# Altium footprint library MainFPs.PcbLib: 206 footprints (part 9 of 13)
Each footprint in its own frame and in the unit in brackets; x right, y up, seen from the top. Pads: shape width x height; smd on the part's side, far side on the other; paste and mask are expansions set on the pad; w line width, h text height; cw(c..) or ccw(c..) is an arc to the next point about the centre after c.
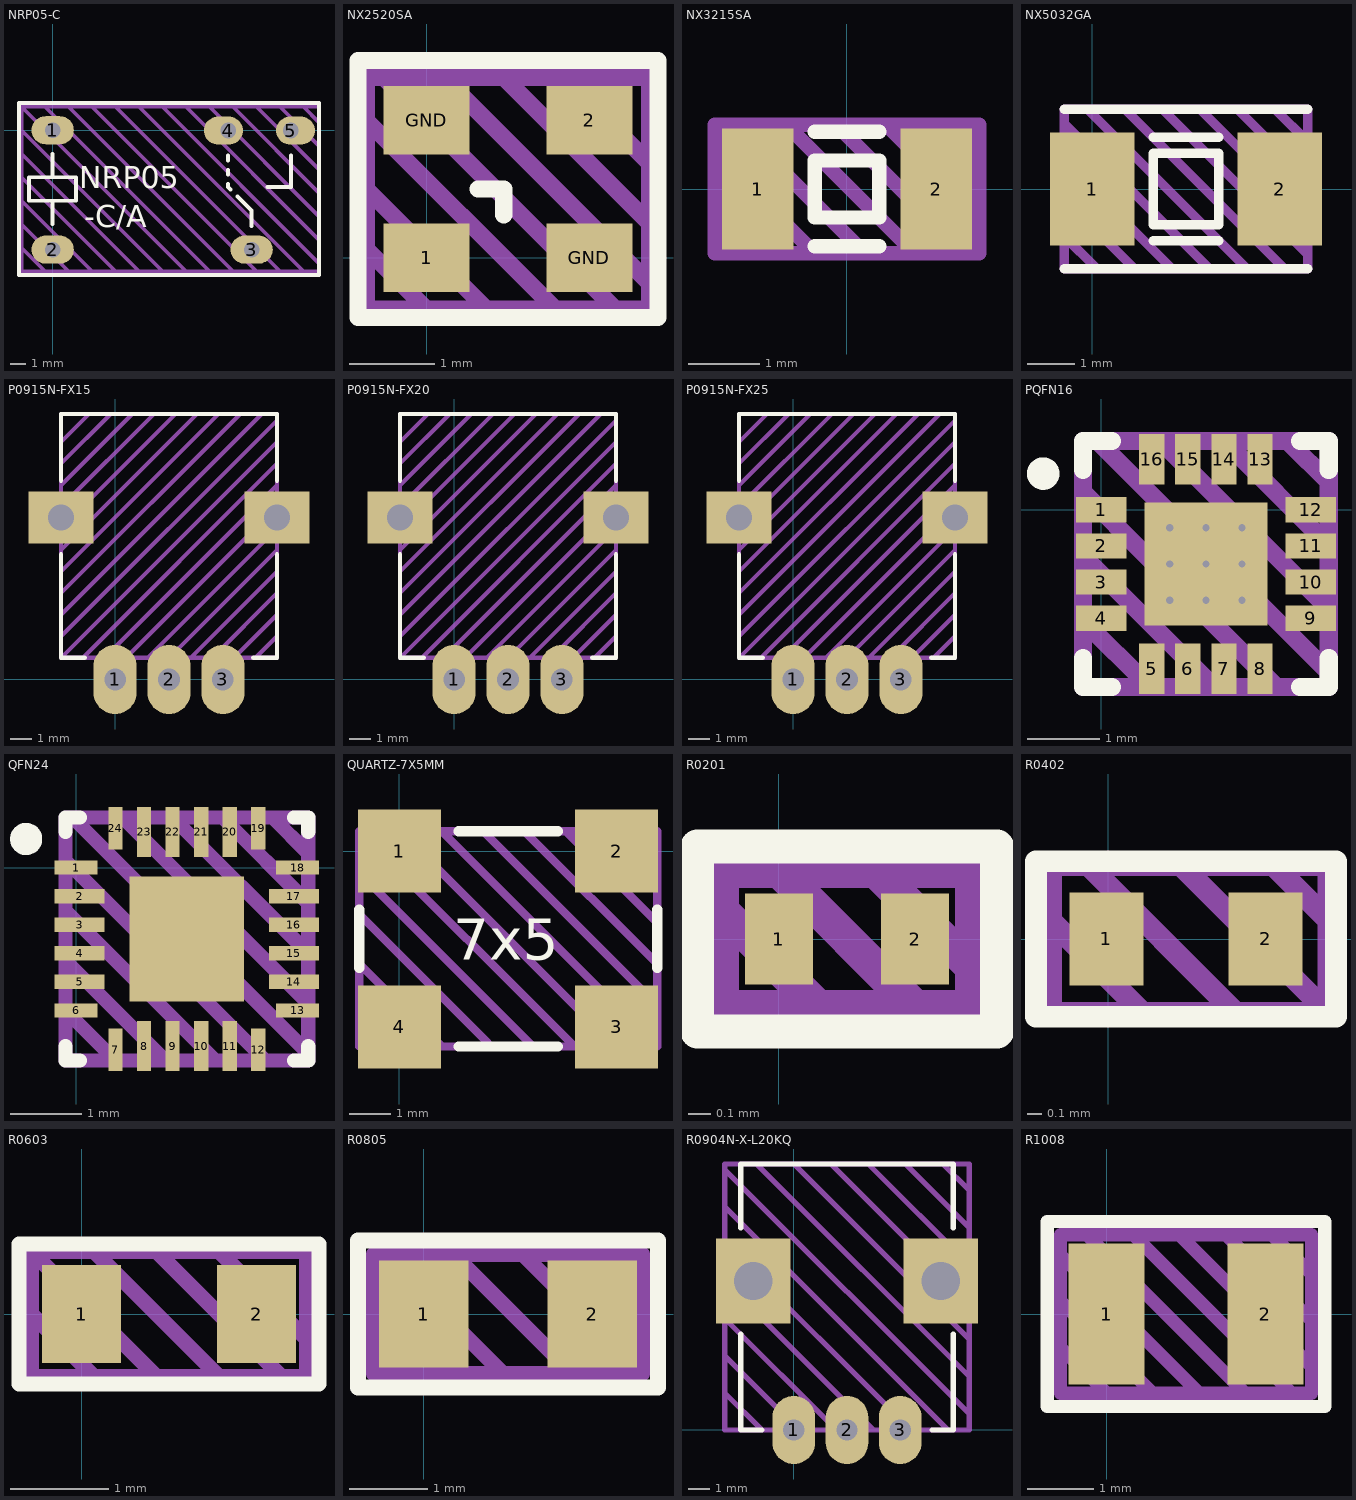
[diagram p8: the footprints below, top view; thin cyan lines are the x and y axes]

## NRP05-C [mm]
pads (5):
  oval 2.7x1.8 hole 1: 1(0,0) 2(0,-7.62) 3(12.7,-7.62)
  oval 2.5x1.8 hole 1 copper offset -0.3,0: 4(11.2,-0.02)
  oval 2.5x1.8 hole 1 copper offset 0.3,0: 5(15.2,-0.02)
Top Overlay:
  lines w0.25: 0,-6 0,-4.5 ; 0,-3 0,-1.5 ; 11.2,-3.42 11.2,-3.52 11.2,-3.62 11.35,-3.77 ; 11.2,-2.82 11.2,-2.52 ; 11.2,-1.92 11.2,-1.62 ; 12.7,-6.12 12.7,-5.12 11.8,-4.22 ; 13.7,-3.62 14.2,-3.62 15.2,-3.62 15.2,-1.62 ; 11.8,-4.22 11.8,-4.22 ; -2.15,-9.25 17,-9.25 17,1.75 -2.15,1.75 -2.15,-9.25 ; -1.5,-4.5 -1.5,-3 1.5,-3 1.5,-4.5 -1.5,-4.5
  text "-C/A" at 2,-6.2 h1.4
  text "NRP05" at 1.7,-3.7 h1.4
Draw:
  lines w0.25: -2,-6 1,-9 1.5,-9 ; -2,-4.5 2.5,-9 ; -2,-3 4,-9 ; -2,-1.5 5.5,-9 6,-9 ; -2,0 7,-9 7.5,-9 ; -0.5,-9 -2,-7.5 ; -0.5,1.5 10,-9 10.5,-9 ; 1,1.5 11.5,-9 ; 2.5,1.5 13,-9 ; 4,1.5 14.5,-9 ; 5.5,1.5 16,-9 ; 7,1.5 17,-8.5 ; 8.5,1.5 17,-7 17,-7.5 ; 9,-9 8.5,-9 -2,1.5 ; 10,1.5 17,-5.5 17,-6 ; 11.5,1.5 17,-4 ; 13,1.5 17,-2.5 17,-3 ; 14.5,1.5 17,-1 17,-1.5 ; 16,1.5 17,0.5 ; -2,-7.5 -2,-7.5 ; -2,1.5 -2,-9 17,-9 17,1.5 -2,1.5 ; 2.5,-9 2.5,-9 ; 17,0.5 17,0.5
Info:
  text "'.Comment'" at -1.905,-12.065 h2
3D body: height 1, standoff -3, extent 12.55,-8.02 12.85,-7.22
3D body: height 1, standoff -3, extent 15.039,-0.425 15.339,0.375
3D body: height 1, standoff -3, extent 11.051,-0.425 11.351,0.375
3D body: height 1, standoff -3, extent -0.15,-8 0.15,-7.2
3D body: height 1, standoff -3, extent -0.15,-0.4 0.15,0.4
3D body: height 15.6, standoff 0.4, extent -2,-9 16.9,1.5
3D body: height 0.6, standoff 0, extent 0.5,-9 1.8,-8.7
3D body: height 0.6, standoff 0, extent 12.7,-9 14,-8.7
3D body: height 0.6, standoff 0, extent 12.7,1.2 14,1.5
3D body: height 0.6, standoff 0, extent 0.5,1.2 1.8,1.5

## NX2520SA [mm]
pads (4):
  rect 1x0.8 smd: 1(0,0) 2(1.9,1.6) GND(0,1.6) GND(1.9,0)
Top Overlay:
  lines w0.2: 0.6,0.8 0.9,0.8 0.9,0.5 ; -0.8,-0.7 2.7,-0.7 2.7,2.3 -0.8,2.3 -0.8,-0.7
Draw:
  lines w0.2: -0.7,0.1 0,-0.6 0.2,-0.6 ; -0.7,0.8 0.7,-0.6 1,-0.6 ; -0.7,1.6 1.5,-0.6 1.7,-0.6 ; -0.5,2.1 2.2,-0.6 2.4,-0.6 ; 0.2,2.1 2.6,-0.3 ; 0.9,2.1 2.6,0.4 2.6,0.2 ; 1.6,2.1 2.6,1.1 2.6,0.8 ; -0.7,-0.6 2.6,-0.6 2.6,2.1 -0.7,2.1 -0.7,-0.6
Info:
  text "'.Comment'" at -2.286,-1.837 h0.75
3D body: height 0.58, standoff 0, extent -0.275,-0.175 2.175,1.778
3D body: height 0.6, standoff 0.01, extent -0.253,-0.15 2.153,1.75
3D body: height 0.5, standoff 0.02, extent -0.3,-0.2 2.2,1.803

## NX3215SA [mm]
pads (2):
  rect 1x1.7 smd: 1(-1.25,0) 2(1.25,0)
Top Overlay:
  lines w0.2: -0.45,-0.8 0.45,-0.8 ; -0.45,0.8 0.45,0.8 ; -0.45,-0.4 0.45,-0.4 0.45,0.4 -0.45,0.4 -0.45,-0.4
Draw:
  lines w0.2: -1.85,-0.2 -1.15,-0.9 -0.95,-0.9 -1.35,-0.9 ; -1.85,0.5 -0.45,-0.9 -0.15,-0.9 ; -1.55,0.9 0.25,-0.9 0.45,-0.9 ; -0.85,0.9 0.95,-0.9 ; -0.15,0.9 1.65,-0.9 ; 0.55,0.9 1.85,-0.4 1.85,-0.6 ; 1.25,0.9 1.85,0.3 1.85,0 ; -1.85,-0.9 -1.85,0.9 1.85,0.9 1.85,-0.9 -1.85,-0.9
Info:
  text "'.Comment'" at -3.186,-2.037 h0.75
3D body: height 0.58, standoff 0.01, extent -1.45,-0.8 1.45,0.8
3D body: height 0.6, standoff 0.01, extent -1.425,-0.775 1.425,0.775
3D body: height 0.5, standoff 0, extent -1.475,-0.825 1.475,0.825

## NX5032GA [mm] "SMD Glass Sealing Crystals"
pads (2):
  rect 1.8x2.4 smd: 1(0,0) 2(4,0)
Top Overlay:
  lines w0.2: -0.6,-1.7 4.6,-1.7 ; -0.6,1.7 4.6,1.7 ; 1.3,-1.1 2.7,-1.1 ; 1.3,1.1 2.7,1.1 ; 1.3,-0.762 2.7,-0.762 2.7,0.762 1.3,0.762 1.3,-0.762
Draw:
  lines w0.2: -0.6,-1 0.1,-1.7 ; -0.6,-0.2 0.9,-1.7 ; -0.6,0.6 1.7,-1.7 ; -0.6,1.4 2.5,-1.7 ; -0.1,1.7 3.3,-1.7 ; 0.7,1.7 4.1,-1.7 ; 1.5,1.7 4.6,-1.4 ; 2.3,1.7 4.6,-0.6 ; 3.1,1.7 4.6,0.2 ; 3.9,1.7 4.6,1 ; -0.6,-1.7 -0.6,1.7 4.6,1.7 4.6,-1.7 -0.6,-1.7
Info:
  text "'.Comment'" at -1.186,-2.837 h0.75
3D body: height 0.6, standoff 0, extent -0.6,-1.7 4.6,1.7
3D body: height 0.8, standoff 0.6, extent -0.4,-1.5 4.4,1.5

## P0915N-FX15 [mm] "Model P09x Series Potentiometer"
pads (5):
  oval 2x3.2 hole 1: 1(0,0) 2(2.5,0) 3(5,0)
  rect 3x2.4 hole 1.2 square: ""(-2.5,7.5) ""(7.5,7.5)
Top Overlay:
  lines w0.2: -2.5,5.8 -2.5,1 -1.4,1 ; -2.5,9.2 -2.5,12.3 7.5,12.3 7.5,9.2 ; 6.4,1 7.5,1 7.5,5.8
Draw:
  lines w0.2: -2.5,2 7.5,12 ; -2.5,3 6.8,12.3 ; -2.5,4 5.8,12.3 ; -2.5,5 4.8,12.3 ; -2.5,6 3.8,12.3 ; -2.5,7 2.8,12.3 ; -2.5,8 1.8,12.3 ; -2.5,9 0.8,12.3 ; -2.5,10 -0.2,12.3 ; -2.5,11 -1.2,12.3 ; -1.5,1 7.5,10 ; -0.5,1 7.5,9 ; 0.5,1 7.5,8 ; 1.5,1 7.5,7 ; 2.5,1 7.5,6 ; 3.5,1 7.5,5 ; 4.5,1 7.5,4 ; 5.5,1 7.5,3 ; 6.5,1 7.5,2 ; 7.5,11 -2.5,1 ; -2.5,1 -2.5,12.3 7.5,12.3 7.5,1 -2.5,1
Info:
  text "'.Comment'" at -2.811,-3.429 h1.25
3D body "P0915N-EC15B.step": height 25, standoff -3.3, extent -3.548,-0.15 8.548,12.35

## P0915N-FX20 [mm] "Model P09x Series Potentiometer"
pads (5):
  oval 2x3.2 hole 1: 1(0,0) 2(2.5,0) 3(5,0)
  rect 3x2.4 hole 1.2 square: ""(-2.5,7.5) ""(7.5,7.5)
Top Overlay:
  lines w0.2: -2.5,5.8 -2.5,1 -1.4,1 ; -2.5,9.2 -2.5,12.3 7.5,12.3 7.5,9.2 ; 6.4,1 7.5,1 7.5,5.8
Draw:
  lines w0.2: -2.5,2 7.5,12 ; -2.5,3 6.8,12.3 ; -2.5,4 5.8,12.3 ; -2.5,5 4.8,12.3 ; -2.5,6 3.8,12.3 ; -2.5,7 2.8,12.3 ; -2.5,8 1.8,12.3 ; -2.5,9 0.8,12.3 ; -2.5,10 -0.2,12.3 ; -2.5,11 -1.2,12.3 ; -1.5,1 7.5,10 ; -0.5,1 7.5,9 ; 0.5,1 7.5,8 ; 1.5,1 7.5,7 ; 2.5,1 7.5,6 ; 3.5,1 7.5,5 ; 4.5,1 7.5,4 ; 5.5,1 7.5,3 ; 6.5,1 7.5,2 ; 7.5,11 -2.5,1 ; -2.5,1 7.5,1 7.5,12.3 -2.5,12.3 -2.5,1
Info:
  text "'.Comment'" at -2.811,-3.429 h1.25
3D body "P0915N-SC20B.step": height 30, standoff -3.3, extent -3.548,-0.15 8.548,12.35

## P0915N-FX25 [mm] "Model P09x Series Potentiometer"
pads (5):
  oval 2x3.2 hole 1: 1(0,0) 2(2.5,0) 3(5,0)
  rect 3x2.4 hole 1.2 square: ""(-2.5,7.5) ""(7.5,7.5)
Top Overlay:
  lines w0.2: -2.5,5.8 -2.5,1 -1.4,1 ; -2.5,9.2 -2.5,12.3 7.5,12.3 7.5,9.2 ; 6.4,1 7.5,1 7.5,5.8
Draw:
  lines w0.2: -2.5,2 7.5,12 ; -2.5,3 6.8,12.3 ; -2.5,4 5.8,12.3 ; -2.5,5 4.8,12.3 ; -2.5,6 3.8,12.3 ; -2.5,7 2.8,12.3 ; -2.5,8 1.8,12.3 ; -2.5,9 0.8,12.3 ; -2.5,10 -0.2,12.3 ; -2.5,11 -1.2,12.3 ; -1.5,1 7.5,10 ; -0.5,1 7.5,9 ; 0.5,1 7.5,8 ; 1.5,1 7.5,7 ; 2.5,1 7.5,6 ; 3.5,1 7.5,5 ; 4.5,1 7.5,4 ; 5.5,1 7.5,3 ; 6.5,1 7.5,2 ; 7.5,11 -2.5,1 ; -2.5,1 7.5,1 7.5,12.3 -2.5,12.3 -2.5,1
Info:
  text "'.Comment'" at -2.811,-3.429 h1.25
3D body "P0915N-SC25B.step": height 35, standoff -3.3, extent -3.548,-0.15 8.548,12.35

## PQFN16 [mm]
height 0.8
pads (17):
  rect 0.7x0.35 smd: 1(0,0) 2(0,-0.5) 3(0,-1) 4(0,-1.5) 9(2.9,-1.5) 10(2.9,-1) 11(2.9,-0.5) 12(2.9,0)
  rect 0.35x0.7 smd: 5(0.7,-2.2) 6(1.2,-2.2) 7(1.7,-2.2) 8(2.2,-2.2) 13(2.2,0.7) 14(1.7,0.7) 15(1.2,0.7) 16(0.7,0.7)
  rect 1.7x1.7 smd: ""(1.45,-0.75)
via 1.45,-0.75 diameter 0.3 hole 0.1
via 0.95,-0.75 diameter 0.3 hole 0.1
via 1.95,-0.75 diameter 0.3 hole 0.1
via 1.95,-0.25 diameter 0.3 hole 0.1
via 1.45,-0.25 diameter 0.3 hole 0.1
via 0.95,-0.25 diameter 0.3 hole 0.1
via 0.95,-1.25 diameter 0.3 hole 0.1
via 1.45,-1.25 diameter 0.3 hole 0.1
via 1.95,-1.25 diameter 0.3 hole 0.1
Top Overlay:
  circle w0.25: c-0.8,0.5 r0.1
  lines w0.25: -0.25,-2.05 -0.25,-2.45 0.15,-2.45 ; -0.25,0.55 -0.25,0.95 0.15,0.95 ; 2.75,-2.45 3.15,-2.45 3.15,-2.05 ; 2.75,0.95 3.15,0.95 3.15,0.55
Draw:
  lines w0.25: -0.241,-1.537 0.66,-2.438 ; -0.241,-0.648 1.537,-2.426 ; -0.241,0.241 2.413,-2.438 ; -0.05,0.95 3.15,-2.25 ; 0.838,0.94 3.15,-1.372 ; 1.726,0.93 3.15,-0.494 3.15,-0.75 ; 2.615,0.919 3.139,0.395 ; -0.25,-2.45 3.15,-2.45 3.15,0.95 -0.25,0.95 -0.25,-2.45
Info:
  text "'.Comment'" at -0.381,-3.302 h0.5
3D body "PQFN16.step": height 0.8, standoff 0, extent -0.125,-2.325 3.025,0.825

## QFN24 [mm]
height 1
pads (25):
  rect 0.6x0.2 smd: 1(0,0) 6(0,-2) 13(3.1,-2) 18(3.1,0)
  rect 0.7x0.2 smd: 2(0.05,-0.4) 3(0.05,-0.8) 4(0.05,-1.2) 5(0.05,-1.6) 14(3.05,-1.6) 15(3.05,-1.2) 16(3.05,-0.8) 17(3.05,-0.4)
  rect 0.2x0.6 smd: 7(0.55,-2.55) 12(2.55,-2.55) 19(2.55,0.55) 24(0.55,0.55)
  rect 0.2x0.7 smd: 8(0.95,-2.5) 9(1.35,-2.5) 10(1.75,-2.5) 11(2.15,-2.5) 20(2.15,0.5) 21(1.75,0.5) 22(1.35,0.5) 23(0.95,0.5)
  rect 1.6x1.75 smd: ""(1.55,-1)
Top Overlay:
  circle w0.25: c-0.7,0.4 r0.1
  lines w0.2: -0.15,-2.5 -0.15,-2.7 0.05,-2.7 ; -0.15,0.5 -0.15,0.7 0.05,0.7 ; 3.05,-2.7 3.25,-2.7 3.25,-2.5 ; 3.05,0.7 3.25,0.7 3.25,0.5
Draw:
  lines w0.2: -0.15,-2 0.55,-2.7 ; -0.15,-1.3 1.25,-2.7 ; -0.15,-0.6 1.95,-2.7 ; -0.15,0.1 2.65,-2.7 ; -0.05,0.7 3.25,-2.6 ; 0.65,0.7 3.25,-1.9 ; 1.35,0.7 3.25,-1.2 ; 2.05,0.7 3.25,-0.5 ; 2.75,0.7 3.25,0.2 ; -0.15,-2.7 3.25,-2.7 3.25,0.7 -0.15,0.7 -0.15,-2.7
Info:
  text "'.Comment'" at -0.574,-3.692 h0.5
3D body "QFN24.step": height 1, standoff 0, extent -0.01,-2.56 3.11,0.56

## QUARTZ-7X5MM [mm]
pads (4):
  rect 2x2 smd: 1(0,0) 2(5.25,0) 3(5.25,-4.25) 4(0,-4.25)
Top Overlay:
  lines w0.25: -0.971,-2.821 -0.971,-1.421 ; 1.429,-4.721 3.829,-4.721 ; 1.429,0.479 3.829,0.479 ; 6.229,-2.821 6.229,-1.421
  text "7x5" at 1.296,-2.621 h1
Draw:
  lines w0.2: -0.971,-3.721 0.029,-4.721 ; -0.971,-2.721 1.029,-4.721 ; -0.971,-1.521 2.129,-4.621 ; -0.971,-0.521 3.229,-4.721 ; 0.029,0.479 5.229,-4.721 ; 1.029,0.479 6.229,-4.721 ; 2.029,0.479 6.229,-3.721 ; 3.029,0.479 6.229,-2.721 ; 4.029,0.479 6.229,-1.721 ; 4.229,-4.721 -0.971,0.479 ; 5.029,0.479 6.229,-0.721 ; -0.971,0.479 6.229,0.479 6.229,-4.721 ; -0.971,0.479 -0.971,-4.721 6.229,-4.721
Info:
  text "'.Comment'" at -1.62,-6.704 h1
3D body: height 1.7, standoff 1.5, extent -0.991,-4.75 6.248,0.508
3D body: height 2, standoff 1.7, extent -0.749,-4.496 6.007,0.254
3D body: height 1.5, standoff 0.1, extent -0.991,-4.75 6.248,0.508

## R0201 [mm]
height 0.3
pads (2):
  rect 0.3x0.4 smd: 1(0,0) 2(0.6,0)
Top Overlay:
  lines w0.15: -0.36,-0.406 0.96,-0.406 0.96,0.381 0.96,0.406 -0.36,0.406 -0.36,-0.406
Draw:
  lines w0.15: -0.25,0.125 0.175,-0.3 ; 0,0.3 0.6,-0.3 ; 0.425,0.3 0.85,-0.125 ; -0.25,-0.3 -0.25,0.3 0.85,0.3 0.85,-0.3 -0.25,-0.3
Info:
  text "'.Comment'" at -0.762,-0.846 h0.25
3D body "Chip2PinSM127P600-8N.step": height 0.25, standoff 0, extent 0,-0.15 0.6,0.15

## R0402 [mil]
pads (2):
  rect 20x25 smd: 1(-0.47,0.04) 2(42.53,0.04)
Top Overlay:
  lines w5.91: -19.47,-20.96 61.53,-20.96 61.53,21.04 -19.47,21.04 -19.47,-20.96
Draw:
  lines w5.91: -15.47,5.04 9.53,-19.96 ; -5.47,20.04 34.53,-19.96 ; 19.53,20.04 59.53,-19.96 ; 44.53,20.04 59.53,5.04 ; 59.53,-19.96 -15.47,-19.96 -15.47,20.04 59.53,20.04 59.53,-19.96
Info:
  text "'.Comment'" at -38.86,-43.47 h13.78
3D body "RESC1005X04N.step": height 15.75, standoff 0, extent -0.47,-10.4 40.47,10.46

## R0603 [mm]
pads (2):
  rect 0.8x1 smd: 1(0,0) 2(1.778,0)
Top Overlay:
  lines w0.15: -0.635,-0.711 -0.635,0.711 2.413,0.711 2.413,-0.711 -0.635,-0.711
Draw:
  lines w0.15: -0.508,0 0.127,-0.635 ; 0.127,0.635 1.397,-0.635 ; 0.762,-0.635 -0.508,0.635 ; 0.762,0.635 2.032,-0.635 ; 1.397,0.635 2.286,-0.254 ; -0.508,0.635 -0.508,-0.635 2.286,-0.635 2.286,0.635 -0.508,0.635
Info:
  text "'.Comment'" at -1.224,-1.492 h0.5
3D body "Chip2PinSM127P600-8N.step": height 0.5, standoff 0, extent 0.104,-0.395 1.674,0.395

## R0805 [mil]
pads (2):
  rect 45x54 smd: 1(0,0) 2(85,0)
Top Overlay:
  lines w7.87: -33,-37 -33,37 118,37 118,-37 -33,-37
Draw:
  lines w7.87: -25,0 5,-30 ; -20,30 40,-30 ; 15,30 75,-30 ; 35,-30 42.5,-30 ; 50,30 110,-30 ; 85,30 110,5 ; 110,-30 110,30 -25,30 -25,-30 110,-30
Info:
  text "'.Comment'" at -82.14,-84.15 h29.53
3D body "Chip2PinSM127P600-8N999.step": height 23.62, standoff 0, extent 2.06,-25.98 83.95,25.99

## R0904N-X-L20KQ [mm] "R0904N Family Potentiometer"
pads (5):
  oval 2x3.2 hole 1: 1(0,0) 2(2.5,0) 3(5,0)
  rect 3.5x4 hole 1.8 square: ""(-1.9,7) ""(6.9,7)
Top Overlay:
  lines w0.25: -2.5,4.5 -2.5,0 -1.5,0 ; -2.5,9.5 -2.5,12.5 7.5,12.5 7.5,9.5 ; 6.5,0 7.5,0 7.5,4.5
Draw:
  lines w0.25: -3.25,1.75 -1.5,0 ; -3.25,3.5 0.25,0 ; -3.25,5.25 2,0 ; -3.25,7 3.75,0 ; -3.25,8.75 5.5,0 ; -3.25,10.5 7.25,0 ; -3.25,12.25 8.25,0.75 ; -1.75,12.5 8.25,2.5 ; 0,12.5 8.25,4.25 ; 1.75,12.5 8.25,6 ; 3.5,12.5 8.25,7.75 ; 5.25,12.5 8.25,9.5 ; 7,12.5 8.25,11.25 ; -3.25,0 8.25,0 8.25,12.5 -3.25,12.5 -3.25,0
Info:
  text "'.Comment'" at -1.749,-3.083 h1
3D body "R0904N-L-20KQ.stp": height 20, standoff -3.79, extent -3.2,-0.15 8.2,12.5

## R1008 [mm]
pads (2):
  rect 1.15x2.14 smd: 1(0,0) 2(2.4,0)
Top Overlay:
  lines w0.2: -0.9,-1.4 -0.9,1.4 3.3,1.4 3.3,-1.4 -0.9,-1.4
Draw:
  lines w0.2: -0.7,-0.5 0,-1.2 ; -0.7,0.2 0.7,-1.2 ; -0.7,0.9 1.4,-1.2 ; -0.3,1.2 2.1,-1.2 ; 0.4,1.2 2.8,-1.2 ; 1.1,1.2 3.1,-0.8 ; 1.8,1.2 3.1,-0.1 ; 2.5,1.2 3.1,0.6 ; -0.7,-1.2 -0.7,1.2 3.1,1.2 3.1,-1.2 -0.7,-1.2
Info:
  text "'.Comment'" at -1.986,-2.537 h0.75
3D body "RESC2520X09N.step": height 0.9, standoff 0, extent -0.05,-1 2.45,1